# Altium footprint library NASCO 3D PCBLIB.PcbLib: 108 footprints (part 4 of 7)
Each footprint in its own frame and in the unit in brackets; x right, y up, seen from the top. Pads: shape width x height; smd on the part's side, far side on the other; paste and mask are expansions set on the pad; w line width, h text height; cw(c..) or ccw(c..) is an arc to the next point about the centre after c.
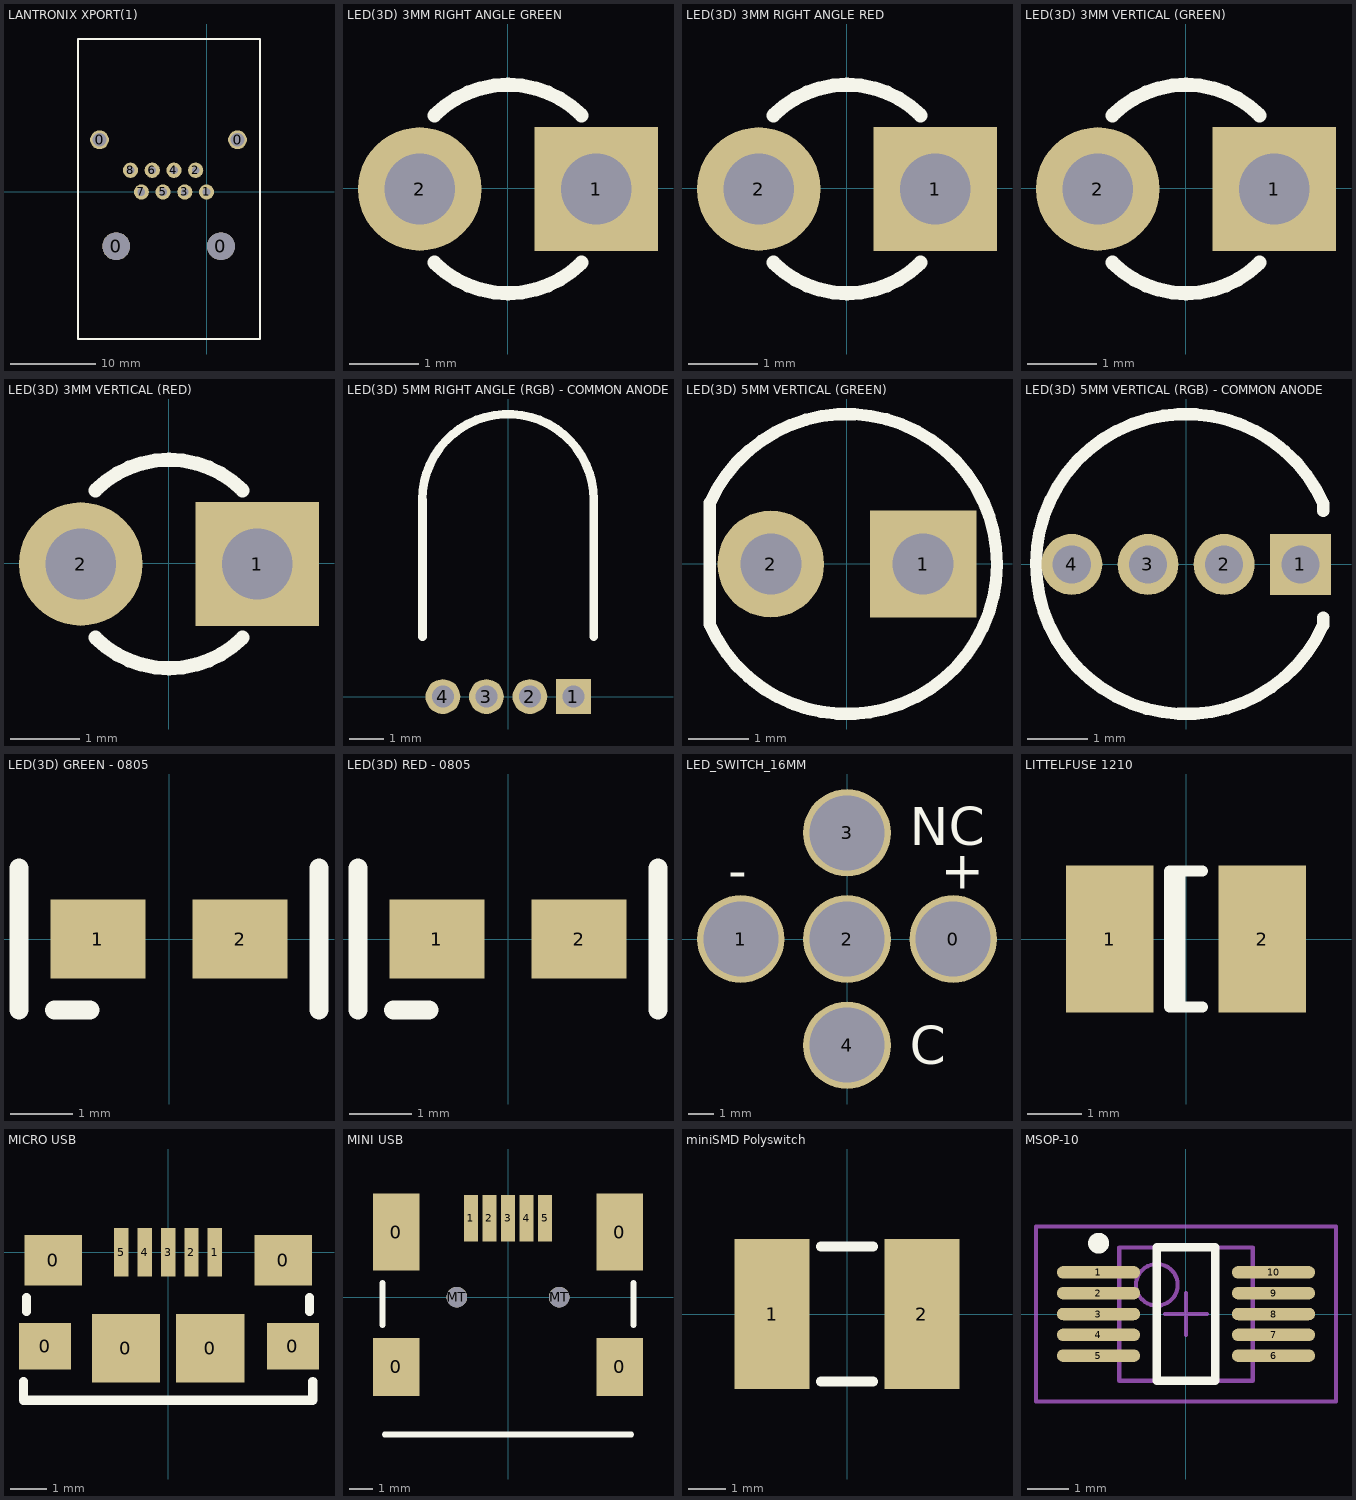
[diagram p3: the footprints below, top view; thin cyan lines are the x and y axes]

## LANTRONIX XPORT(1) [mil] "xp1001001-03r"
pads (12):
  round 86.61 hole 62.99: 0(-492.67,240.16) 0(142.67,240.16)
  round 127.95 hole 127.95 unplated: 0(-416,-250) 0(66,-250)
  round 70 hole 35: 1(0,0) 2(-50,100) 3(-100,0) 4(-150,100) 5(-200,0) 6(-250,100) 7(-300,0) 8(-350,100)
Top Overlay:
  lines w10: -591.11,-677 -591.11,704.41 245.51,704.41 245.51,-677 -591.11,-677
3D body "xport-03_assy.stp": height 626.58, standoff -170.72, extent -591.11,-677 245.51,704.41

## LED(3D) 3MM RIGHT ANGLE GREEN [mil]
pads (2):
  rect 70x70 hole 40: 1(50.06,-0.28)
  round 70 hole 40: 2(-49.94,-0.28)
Top Overlay:
  lines w8: -41.7,-42.04 ccw(c0.06,-0.28) 41.82,-42.04 ; -41.7,41.47 cw(c0.06,-0.28) 41.82,41.47
3D body "User Library-LED_d3-GRN.STEP": height 143.81, standoff 14.01, extent -65.51,-55.23 61,239.06

## LED(3D) 3MM RIGHT ANGLE RED [mil]
pads (2):
  rect 70x70 hole 40: 1(50.06,-0.28)
  round 70 hole 40: 2(-49.94,-0.28)
Top Overlay:
  lines w8: -41.7,-42.04 ccw(c0.06,-0.28) 41.82,-42.04 ; -41.7,41.47 cw(c0.06,-0.28) 41.82,41.47
3D body "User Library-LED_d3-RED.STEP": height 143.81, standoff 14.01, extent -65.51,-53.42 61,240.87

## LED(3D) 3MM VERTICAL (GREEN) [mil]
pads (2):
  rect 70x70 hole 40: 1(50.06,-0.28)
  round 70 hole 40: 2(-49.94,-0.28)
Top Overlay:
  lines w8: -41.7,-42.04 ccw(c0.06,-0.28) 41.82,-42.04 ; -41.7,41.47 cw(c0.06,-0.28) 41.82,41.47
3D body "User Library-LED_d3-GRN.STEP": height 195.87, standoff -98.43, extent -65.45,-65.35 61.06,64.45

## LED(3D) 3MM VERTICAL (RED) [mil]
pads (2):
  rect 70x70 hole 40: 1(50.06,-0.28)
  round 70 hole 40: 2(-49.94,-0.28)
Top Overlay:
  lines w8: -41.7,-42.04 ccw(c0.06,-0.28) 41.82,-42.04 ; -41.7,41.47 cw(c0.06,-0.28) 41.82,41.47
3D body "User Library-LED_d3-RED.STEP": height 207.47, standoff -86.83, extent -65.51,-66.07 61,63.74

## LED(3D) 5MM RIGHT ANGLE (RGB) - COMMON ANODE [mil]
height 27.95
pads (4):
  rect 40x40 hole 25: 1(75,0)
  round 40 hole 25: 2(25,0) 3(-25,0) 4(-75,0)
Top Overlay:
  lines w10: -98.62,226.38 cw(c-0.19,226.38) 98.23,226.38 98.23,69.09 ; -98.43,68.9 -98.43,226.18
3D body: height 200.79, standoff 4.71, extent -98.23,68.9 98.23,226.38
3D body: height 200.79, standoff 3.94, extent -97.39,128.38 98.43,324.39

## LED(3D) 5MM VERTICAL (GREEN) [mil]
pads (2):
  rect 70x70 hole 40: 1(50.06,-0.28)
  round 70 hole 40: 2(-49.94,-0.28)
Top Overlay:
  lines w8: -89.78,-39.99 -90,-39.99 ; -69.54,-69.88 ccw(c0.06,-0.28) 69.66,-69.88 ; -90,-39.99 ccw(c0.06,-0.28) -89.78,39.91 -90,39.91 -90,-39.99
3D body: height 413.39, standoff 216.54, extent -98.43,-97.59 97.4,98.43
3D body: height 314.96, standoff 157.48, extent -98.55,-98.04 97.52,98.43
3D body: height 157.48, standoff -78.74, extent -64.96,-9.84 -35.43,9.84
3D body: height 157.48, standoff -78.74, extent 35.43,-9.84 64.96,9.84

## LED(3D) 5MM VERTICAL (RGB) - COMMON ANODE [mil]
height 27.95
pads (4):
  rect 40x40 hole 25: 1(75,0)
  round 40 hole 25: 2(25,0) 3(-25,0) 4(-75,0)
Top Overlay:
  lines w8: -69.66,69.88 cw(c-0.06,0.28) 69.54,69.88 ; 89.78,39.99 90,39.99 ; 90,-34.91 90,-39.91 89.78,-39.91 cw(c-0.06,0.28) 90,39.99 ; 90,35 90,39.99
3D body: height 157.48, standoff -78.74, extent 20,-5 30,5
3D body: height 157.48, standoff -78.74, extent -30,-5 -20,5
3D body: height 157.48, standoff -78.74, extent -80,-5 -70,5
3D body: height 413.39, standoff 216.54, extent -98.42,-97.59 97.4,98.42
3D body: height 314.96, standoff 157.48, extent -98.55,-98.04 97.52,98.42
3D body: height 157.48, standoff -78.74, extent 70,-5 80,5

## LED(3D) GREEN - 0805 [mil]
pads (2):
  rect 60x50 smd: 1(-45,0) 2(45,0)
Top Overlay:
  lines w12: -95,-45 -95,45 ; -72.5,-45 -50,-45 ; 95,-45 95,45
3D body: height 19.68, standoff 0, extent -31.99,-24.61 31.99,24.61
3D body: height 21.65, standoff 0, extent -39.37,-24.61 -24.61,24.61
3D body: height 21.65, standoff 0, extent 24.61,-24.61 39.37,24.61

## LED(3D) RED - 0805 [mil]
pads (2):
  rect 60x50 smd: 1(-45,0) 2(45,0)
Top Overlay:
  lines w12: -95,-45 -95,45 ; -72.5,-45 -50,-45 ; 95,-45 95,45
3D body: height 21.65, standoff 0, extent 24.61,-24.61 39.37,24.61
3D body: height 21.65, standoff 0, extent -39.37,-24.61 -24.61,24.61
3D body: height 19.68, standoff 0, extent -31.99,-24.61 31.99,24.61

## LED_SWITCH_16MM [mm] "LED Switch 16mm"
height 35
pads (5):
  round 3.5 hole 3: 0(4.25,0) 1(-4.25,0) 2(0,0) 3(0,4.25) 4(0,-4.25)
Top Overlay:
  text "+" at 3.75,2 h1.52
  text "-" at -4.75,2 h1.52
  text "NC" at 2.5,3.75 h1.52
  text "C" at 2.5,-5 h1.52

## LITTELFUSE 1210 [mm] "Chip Capacitor; Body 3.2 x 2.5 mm (LxW typ)"
height 1.7
pads (2):
  rect 1.6x2.7 smd: 1(-1.4,0) 2(1.4,0)
Top Overlay:
  lines w0.2: -0.11,-1.25 -0.11,1.25 ; 0.3,-1.25 -0.3,-1.25 -0.3,1.25 0.3,1.25
3D body "User Library-Fuse1210.STEP": height 0.67, standoff 0, extent -1.608,-1.288 1.607,1.287

## MICRO USB [mm] "TE CONNECTIVITY 1981568-1"
pads (11):
  rect 1.45x1.3 smd: 0(-3.425,-2.625) 0(3.475,-2.625)
  rect 1.6x1.4 smd: 0(-3.2,-0.225) 0(3.2,-0.225)
  rect 1.9x1.9 smd: 0(-1.175,-2.675) 0(1.175,-2.675)
  rect 0.4x1.35 smd: 1(1.3,0) 2(0.65,0) 3(0,0) 4(-0.65,0) 5(-1.3,0)
Top Overlay:
  lines w0.254: -4.025,-3.6 -4.025,-4.125 0,-4.125 4.025,-4.125 4.025,-3.6 ; -3.937,-1.651 -3.937,-1.27 ; 3.937,-1.651 3.937,-1.27
3D body "Micro USB TE Connectivity 1981568-1.stp": height 2.83, standoff -0.25, extent -3.975,-5.3 4.025,0.3

## MINI USB [mm] "KEYSTONE ELECTRONICS 934"
pads (11):
  rect 2x2.5 smd: 0(-4.8,-3) 0(4.8,-3)
  rect 2x3.3 smd: 0(-4.8,2.8) 0(4.8,2.8)
  rect 0.6x2 smd: 1(-1.6,3.4) 2(-0.8,3.4) 3(0,3.4) 4(0.8,3.4) 5(1.6,3.4)
  round 0.89 hole 0.89 unplated: MT(-2.2,0) MT(2.2,0)
Top Overlay:
  lines w0.254: -5.4,-1.2 -5.4,0.6 ; -5.3,-5.9 5.3,-5.9 ; 5.4,-1.2 5.4,0.6
3D body "User Library-USB_mini_B.step": height 3.97, standoff -0.98, extent -5.35,-5.9 5.35,3.3

## miniSMD Polyswitch [mm] "RAYCHEM - MINISMDC050F-2"
pads (2):
  rect 2x4 smd: 1(-2,0) 2(2,0)
Top Overlay:
  lines w0.254: -0.7,-1.8 0.7,-1.8 ; -0.7,1.8 0.7,1.8
3D body: height 0.62, standoff 0, extent -2.4,-1.7 -2,1.7
3D body: height 0.62, standoff 0, extent -2,-1.7 0,1.7
3D body: height 0.62, standoff 0, extent 0,-1.7 2,1.7
3D body: height 0.62, standoff 0, extent 2,-1.7 2.4,1.7

## MSOP-10 [mm] "TSSOP, 10-Leads, Body 3x3mm, Pitch 0.5mm"
height 1.1
pads (10):
  oval 2x0.3 smd: 1(-2.1,1) 2(-2.1,0.5) 3(-2.1,0) 4(-2.1,-0.5) 5(-2.1,-1) 6(2.1,-1) 7(2.1,-0.5) 8(2.1,0) 9(2.1,0.5) 10(2.1,1)
Top Overlay:
  circle w0.25: c-2.1,1.7 r0.125
  lines w0.2: -0.7,-1.6 0.7,-1.6 0.7,1.6 -0.7,1.6 -0.7,-1.6
Mechanical 13:
  circle w0.1: c-0.7,0.7 r0.5
  lines w0.1: -1.6,-1.6 1.6,-1.6 1.6,1.6 -1.6,1.6 -1.6,-1.6
Mechanical 15:
  lines w0.1: -0.5,0 0.5,0 ; 0,-0.5 0,0.5 ; -3.6,-2.1 3.6,-2.1 3.6,2.1 -3.6,2.1 -3.6,-2.1
3D body "User Library-msop-10.step": height 1.15, standoff 0, extent -2.45,-1.5 2.45,1.5